# Altium footprint library footprints.PcbLib: 33 footprints (part 2 of 3)
Each footprint in its own frame and in the unit in brackets; x right, y up, seen from the top. Pads: shape width x height; smd on the part's side, far side on the other; paste and mask are expansions set on the pad; w line width, h text height; cw(c..) or ccw(c..) is an arc to the next point about the centre after c.
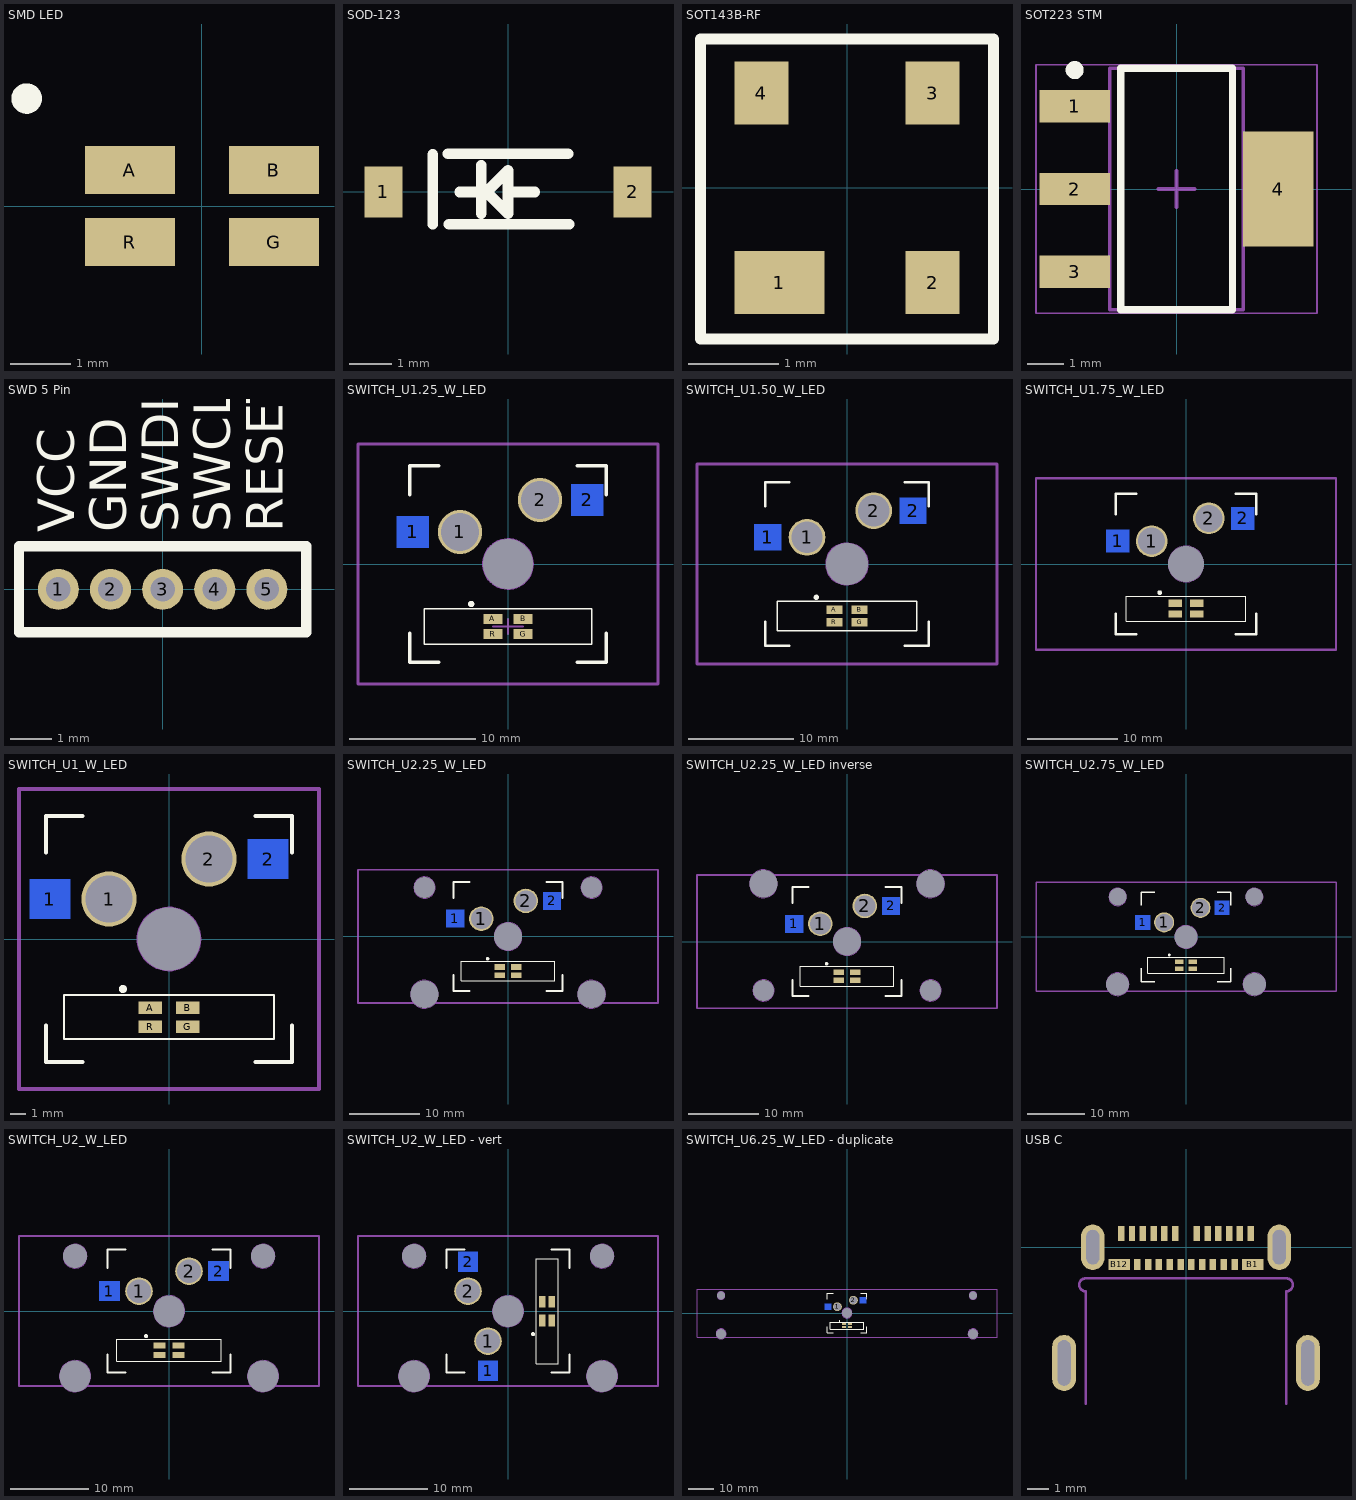
[diagram p1: the footprints below, top view; thin cyan lines are the x and y axes]

## SMD LED [mm] "LED"
pads (4):
  rect 1.5x0.8 smd: A(-1.2,0.6) B(1.2,0.6) G(1.2,-0.6) R(-1.2,-0.6)
Top Overlay:
  circle w0.254: c-2.921,1.791 r0.127
3D body "ASMB-MTB0-0A3A2.step": height 1.91, standoff 0.01, extent -1.93,-1.475 1.57,1.325

## SOD-123 [mm]
pads (2):
  rect 0.9x1.2 smd: 1(-2.95,0) 2(2.95,0)
Top Overlay:
  lines w0.254: -1.778,-0.762 -1.778,0.889 ; -1.422,0.902 1.422,0.902 ; -1.397,-0.762 1.448,-0.762 ; -1.143,0 -0.508,0 ; -0.635,-0.508 -0.635,0.635 ; 0,0 0.635,0 ; -0.508,0 0,0.508 0,-0.508 -0.508,0
3D body: height 1.35, standoff 0, extent -1.778,-0.762 1.448,0.902
3D body: height 1.36, standoff 0, extent -1.778,-0.762 -1.397,0.902

## SOT143B-RF [mm] "Reflow standard, nexperia"
pads (4):
  rect 1x0.7 smd: 1(-0.75,-1.05)
  rect 0.6x0.7 smd: 2(0.95,-1.05) 3(0.95,1.05) 4(-0.95,1.05)
Top Overlay:
  lines w0.127: -1.625,-1.676 1.625,-1.676 1.625,1.651 -1.625,1.651 -1.625,-1.676

## SOT223 STM [mm] "SOT223, 4-Leads, Body 6.50x7.00mm (avg), Pitch 2.30mm, IPC High Density"
height 1.8
pads (4):
  rect 1.95x0.9 smd: 1(-2.825,2.3) 2(-2.825,0) 3(-2.825,-2.3)
  rect 1.95x3.2 smd: 4(2.825,0)
Top Overlay:
  circle w0.25: c-2.825,3.3 r0.125
  lines w0.2: -1.55,-3.35 1.55,-3.35 1.55,3.35 -1.55,3.35 -1.55,-3.35
Mechanical 13:
  lines w0.1: -1.85,-3.35 1.85,-3.35 1.85,3.35 -1.85,3.35 -1.85,-3.35
Mechanical 15:
  lines w0.05: -3.9,-3.45 3.9,-3.45 3.9,3.45 -3.9,3.45 -3.9,-3.45
  lines w0.1: -0.5,0 0.5,0 ; 0,-0.5 0,0.5
3D body: height 1.8, standoff 0.02, extent -1.85,-3.35 1.85,3.35

## SWD 5 Pin [mm]
pads (5):
  round 1 hole 0.6: 1(-2.54,0) 2(-1.27,0) 3(0,0) 4(1.27,0) 5(2.54,0)
Top Overlay:
  lines w0.254: -3.5,-1.05 -3.5,1.05 3.5,1.05 3.5,-1.05 -3.5,-1.05
  text "RESET" at 2.921,1.397 h0.89
  text "SWCLK" at 1.651,1.397 h0.89
  text "SWDIO" at 0.381,1.397 h0.89
  text "GND" at -0.889,1.397 h0.89
  text "VCC" at -2.159,1.397 h0.89
Multi-Layer:
  region: 2.921,-0.762

## SWITCH_U1.25_W_LED [mm] "single mx switch w surface mount led underneath"
pads (9):
  rect 2.55x2.5 smd far side: 1(-7.56,2.54) 2(6.29,5.08)
  round 3.5 hole 3: 1(-3.81,2.54) 2(2.54,5.08)
  rect 1.5x0.8 smd: A(-1.2,-4.36) B(1.2,-4.36) G(1.2,-5.56) R(-1.2,-5.56)
  round 0 hole 3.988: ""(0,0)
Top Overlay:
  circle w0.254: c-2.921,-3.175 r0.127
  lines w0.127: -6.658,-6.36 6.658,-6.36 6.658,-3.56 -6.658,-3.56 -6.658,-6.36
  lines w0.254: -7.8,-5.5 -7.8,-7.8 -5.5,-7.8 ; -7.8,5.5 -7.8,7.8 -5.5,7.8 ; 5.5,-7.8 7.8,-7.8 7.8,-5.5 ; 5.5,7.8 7.8,7.8 7.8,5.5
Bottom Overlay:
  lines w0.254: -6.074,4.064 -6.074,7.239 4.826,7.239 4.826,6.604
Mechanical 1:
  circle w0.127: c0,0 r1.994
Mechanical 13:
  lines w0.127: -1.2,-4.96 1.2,-4.96 ; 0,-5.56 0,-4.36
  lines w0.254: -11.906,-9.525 -11.906,9.525 11.906,9.525 11.906,-9.525 -11.906,-9.525
3D body "kailh socket.STEP": height 1.86, standoff -1.19, extent -7.878,0.858 6.624,6.75
3D body "MXSWITCHCOMPLETE.STEP": height 14.38, standoff -3.39, extent -7.8,-7.8 7.8,7.8
3D body "ASMB-MTB0-0A3A2.step": height 1.91, standoff 0.01, extent -1.93,-6.441 1.57,-3.641

## SWITCH_U1.50_W_LED [mm] "single mx switch w surface mount led underneath"
pads (9):
  rect 2.55x2.5 smd far side: 1(-7.56,2.54) 2(6.29,5.08)
  round 3.5 hole 3: 1(-3.81,2.54) 2(2.54,5.08)
  rect 1.5x0.8 smd: A(-1.2,-4.36) B(1.2,-4.36) G(1.2,-5.56) R(-1.2,-5.56)
  round 0 hole 3.988: ""(0,0)
Top Overlay:
  circle w0.254: c-2.921,-3.175 r0.127
  lines w0.127: -6.658,-6.36 6.658,-6.36 6.658,-3.56 -6.658,-3.56 -6.658,-6.36
  lines w0.254: -7.8,-5.5 -7.8,-7.8 -5.5,-7.8 ; -7.8,5.5 -7.8,7.8 -5.5,7.8 ; 5.5,-7.8 7.8,-7.8 7.8,-5.5 ; 5.5,7.8 7.8,7.8 7.8,5.5
Bottom Overlay:
  lines w0.254: -6.074,4.064 -6.074,7.239 4.826,7.239 4.826,6.604
Mechanical 1:
  circle w0.127: c0,0 r1.994
Mechanical 13:
  lines w0.254: -14.287,-9.525 -14.287,9.525 14.287,9.525 14.287,-9.525 -14.287,-9.525
3D body "kailh socket.STEP": height 1.86, standoff -1.19, extent -7.878,0.858 6.624,6.75
3D body "ASMB-MTB0-0A3A2.step": height 1.91, standoff 0.01, extent -1.93,-6.441 1.57,-3.641
3D body "MXSWITCHCOMPLETE.STEP": height 14.38, standoff -3.39, extent -7.79,-7.67 7.81,7.93

## SWITCH_U1.75_W_LED [mm] "single mx switch w surface mount led underneath"
pads (9):
  rect 2.55x2.5 smd far side: 1(-7.56,2.54) 2(6.29,5.08)
  round 3.5 hole 3: 1(-3.81,2.54) 2(2.54,5.08)
  rect 1.5x0.8 smd: A(-1.2,-4.36) B(1.2,-4.36) G(1.2,-5.56) R(-1.2,-5.56)
  round 0 hole 3.988: ""(0,0)
Top Overlay:
  circle w0.254: c-2.921,-3.175 r0.127
  lines w0.127: -6.658,-6.36 -6.658,-3.56 6.658,-3.56 6.658,-6.36 -6.658,-6.36
  lines w0.254: -7.8,-5.5 -7.8,-7.8 -5.5,-7.8 ; -7.8,5.5 -7.8,7.8 -5.5,7.8 ; 5.5,-7.8 7.8,-7.8 7.8,-5.5 ; 5.5,7.8 7.8,7.8 7.8,5.5
Bottom Overlay:
  lines w0.254: -6.074,4.064 -6.074,7.239 4.826,7.239 4.826,6.604
Mechanical 1:
  circle w0.127: c0,0 r1.994
Mechanical 13:
  lines w0.254: -16.669,-9.525 -16.669,9.525 16.669,9.525 16.669,-9.525 -16.669,-9.525
3D body "kailh socket.STEP": height 1.86, standoff -1.19, extent -7.888,0.857 6.615,6.749
3D body "ASMB-MTB0-0A3A2.step": height 1.91, standoff 0.01, extent -1.98,-6.441 1.52,-3.641
3D body "MXSWITCHCOMPLETE.STEP": height 14.38, standoff -3.39, extent -7.8,-7.8 7.8,7.8

## SWITCH_U1_W_LED [mm] "single mx switch w surface mount led underneath"
pads (9):
  rect 2.55x2.5 smd far side: 1(-7.56,2.54) 2(6.29,5.08)
  round 3.5 hole 3: 1(-3.81,2.54) 2(2.54,5.08)
  rect 1.5x0.8 smd: A(-1.2,-4.36) B(1.2,-4.36) G(1.2,-5.56) R(-1.2,-5.56)
  round 0 hole 3.988: ""(0,0)
Top Overlay:
  circle w0.254: c-2.921,-3.175 r0.127
  lines w0.127: -6.658,-6.36 -6.658,-3.56 6.658,-3.56 6.658,-6.36 -6.658,-6.36
  lines w0.254: -7.8,-5.5 -7.8,-7.8 -5.5,-7.8 ; -7.8,5.5 -7.8,7.8 -5.5,7.8 ; 5.5,-7.8 7.8,-7.8 7.8,-5.5 ; 5.5,7.8 7.8,7.8 7.8,5.5
Bottom Overlay:
  lines w0.254: -6.074,4.064 -6.074,7.239 4.826,7.239 4.826,6.604
Mechanical 1:
  circle w0.127: c0,0 r1.994
Mechanical 13:
  lines w0.254: -9.525,-9.525 9.525,-9.525 9.525,9.525 -9.525,9.525 -9.525,-9.525
3D body "ASMB-MTB0-0A3A2.step": height 1.91, standoff 0.01, extent -1.93,-6.441 1.57,-3.641
3D body "MXSWITCHCOMPLETE.STEP": height 14.38, standoff -3.39, extent -7.8,-7.8 7.8,7.8
3D body "kailh socket.STEP": height 1.71, standoff -1.34, extent -7.879,0.858 6.624,6.75

## SWITCH_U2.25_W_LED [mm] "U2 mx switch w surface mount led underneath"
pads (13):
  rect 2.55x2.5 smd far side: 1(-7.56,2.54) 2(6.29,5.08)
  round 3.5 hole 3: 1(-3.81,2.54) 2(2.54,5.08)
  rect 1.5x0.8 smd: A(-1.2,-4.36) B(1.2,-4.36) G(1.2,-5.56) R(-1.2,-5.56)
  round 0 hole 3.988: ""(-11.938,-8.255) ""(0,0) ""(11.938,-8.255)
  round 0 hole 3.048: ""(-11.938,6.985) ""(11.938,6.985)
Top Overlay:
  circle w0.254: c-2.921,-3.175 r0.127
  lines w0.127: -6.658,-6.36 6.658,-6.36 6.658,-3.56 -6.658,-3.56 -6.658,-6.36
  lines w0.254: -7.8,-5.5 -7.8,-7.8 -5.5,-7.8 ; -7.8,5.5 -7.8,7.8 -5.5,7.8 ; 5.5,-7.8 7.8,-7.8 7.8,-5.5 ; 5.5,7.8 7.8,7.8 7.8,5.5
Bottom Overlay:
  lines w0.254: -6.074,4.064 -6.074,7.239 4.826,7.239 4.826,6.604
Mechanical 1:
  circle w0.127: c11.938,-8.255 r1.994
  circle w0.127: c-11.938,-8.255 r1.994
  circle w0.127: c11.938,6.985 r1.524
  circle w0.127: c-11.938,6.985 r1.524
  circle w0.127: c0,0 r1.994
Mechanical 13:
  lines w0.254: -21.431,-9.525 -21.431,9.525 21.431,9.525 21.431,-9.525 -21.431,-9.525
3D body "MXSWITCHCOMPLETE.STEP": height 14.38, standoff -3.39, extent -7.8,-7.8 7.8,7.8
3D body "ASMB-MTB0-0A3A2.step": height 1.91, standoff 0.01, extent -1.93,-6.441 1.57,-3.641
3D body "Cherry MX Stabilizer.STEP": height 12.17, standoff -2.79, extent -15.338,-10.955 -8.538,8.245
3D body "Cherry MX Stabilizer.STEP": height 12.17, standoff -2.79, extent 8.538,-10.955 15.338,8.245
3D body "kailh socket.STEP": height 1.86, standoff -1.19, extent -7.879,0.858 6.624,6.75

## SWITCH_U2.25_W_LED inverse [mm] "U2 mx switch w surface mount led underneath"
pads (13):
  rect 2.55x2.5 smd far side: 1(-7.56,2.54) 2(6.29,5.08)
  round 3.5 hole 3: 1(-3.81,2.54) 2(2.54,5.08)
  rect 1.5x0.8 smd: A(-1.2,-4.36) B(1.2,-4.36) G(1.2,-5.56) R(-1.2,-5.56)
  round 0 hole 3.048: ""(-11.938,-6.985) ""(11.938,-6.985)
  round 0 hole 3.988: ""(-11.938,8.255) ""(0,0) ""(11.938,8.255)
Top Overlay:
  circle w0.254: c-2.921,-3.175 r0.127
  lines w0.127: -6.658,-6.36 6.658,-6.36 6.658,-3.56 -6.658,-3.56 -6.658,-6.36
  lines w0.254: -7.8,-5.5 -7.8,-7.8 -5.5,-7.8 ; -7.8,5.5 -7.8,7.8 -5.5,7.8 ; 5.5,-7.8 7.8,-7.8 7.8,-5.5 ; 5.5,7.8 7.8,7.8 7.8,5.5
Bottom Overlay:
  lines w0.254: -6.074,4.064 -6.074,7.239 4.826,7.239 4.826,6.604
Mechanical 1:
  circle w0.127: c11.938,8.255 r1.994
  circle w0.127: c11.938,-6.985 r1.524
  circle w0.127: c-11.938,8.255 r1.994
  circle w0.127: c-11.938,-6.985 r1.524
  circle w0.127: c0,0 r1.994
Mechanical 13:
  lines w0.254: -21.431,-9.525 21.431,-9.525 21.431,9.525 -21.431,9.525 -21.431,-9.525

## SWITCH_U2.75_W_LED [mm] "U2 mx switch w surface mount led underneath"
pads (13):
  rect 2.55x2.5 smd far side: 1(-7.56,2.54) 2(6.29,5.08)
  round 3.5 hole 3: 1(-3.81,2.54) 2(2.54,5.08)
  rect 1.5x0.8 smd: A(-1.2,-4.36) B(1.2,-4.36) G(1.2,-5.56) R(-1.2,-5.56)
  round 0 hole 3.988: ""(-11.938,-8.255) ""(0,0) ""(11.938,-8.255)
  round 0 hole 3.048: ""(-11.938,6.985) ""(11.938,6.985)
Top Overlay:
  circle w0.254: c-2.921,-3.175 r0.127
  lines w0.127: -6.658,-6.36 -6.658,-3.56 6.658,-3.56 6.658,-6.36 -6.658,-6.36
  lines w0.254: -7.8,-5.5 -7.8,-7.8 -5.5,-7.8 ; -7.8,5.5 -7.8,7.8 -5.5,7.8 ; 5.5,-7.8 7.8,-7.8 7.8,-5.5 ; 5.5,7.8 7.8,7.8 7.8,5.5
Bottom Overlay:
  lines w0.254: -6.074,4.064 -6.074,7.239 4.826,7.239 4.826,6.604
Mechanical 1:
  circle w0.127: c11.938,-8.255 r1.994
  circle w0.127: c11.938,6.985 r1.524
  circle w0.127: c-11.938,-8.255 r1.994
  circle w0.127: c-11.938,6.985 r1.524
  circle w0.127: c0,0 r1.994
Mechanical 13:
  lines w0.254: -26.194,-9.525 -26.194,9.525 26.194,9.525 26.194,-9.525 -26.194,-9.525
3D body "MXSWITCHCOMPLETE.STEP": height 14.38, standoff -3.39, extent -7.8,-7.8 7.8,7.8
3D body "ASMB-MTB0-0A3A2.step": height 1.91, standoff 0.01, extent -1.57,-6.441 1.93,-3.641
3D body "Cherry MX Stabilizer.STEP": height 12.17, standoff -2.79, extent 8.538,-10.955 15.338,8.245
3D body "Cherry MX Stabilizer.STEP": height 12.17, standoff -2.79, extent -15.338,-10.955 -8.538,8.245
3D body "kailh socket.STEP": height 1.86, standoff -1.19, extent -7.879,0.858 6.624,6.75

## SWITCH_U2_W_LED [mm] "U2 mx switch w surface mount led underneath"
pads (13):
  rect 2.55x2.5 smd far side: 1(-7.56,2.54) 2(6.29,5.08)
  round 3.5 hole 3: 1(-3.81,2.54) 2(2.54,5.08)
  rect 1.5x0.8 smd: A(-1.2,-4.36) B(1.2,-4.36) G(1.2,-5.56) R(-1.2,-5.56)
  round 0 hole 3.988: ""(-11.938,-8.255) ""(0,0) ""(11.938,-8.255)
  round 0 hole 3.048: ""(-11.938,6.985) ""(11.938,6.985)
Top Overlay:
  circle w0.254: c-2.921,-3.175 r0.127
  lines w0.127: -6.658,-6.36 6.658,-6.36 6.658,-3.56 -6.658,-3.56 -6.658,-6.36
  lines w0.254: -7.8,-5.5 -7.8,-7.8 -5.5,-7.8 ; -7.8,5.5 -7.8,7.8 -5.5,7.8 ; 5.5,-7.8 7.8,-7.8 7.8,-5.5 ; 5.5,7.8 7.8,7.8 7.8,5.5
Bottom Overlay:
  lines w0.254: -6.074,4.064 -6.074,7.239 4.826,7.239 4.826,6.604
Mechanical 1:
  circle w0.127: c11.938,-8.255 r1.994
  circle w0.127: c11.938,6.985 r1.524
  circle w0.127: c-11.938,-8.255 r1.994
  circle w0.127: c-11.938,6.985 r1.524
  circle w0.127: c0,0 r1.994
Mechanical 13:
  lines w0.254: -19.05,-9.525 19.05,-9.525 19.05,9.525 -19.05,9.525 -19.05,-9.525
3D body "Cherry MX Stabilizer.STEP": height 12.17, standoff -2.79, extent 8.741,-10.93 15.542,8.27
3D body "ASMB-MTB0-0A3A2.step": height 1.91, standoff 0.01, extent -1.57,-6.441 1.93,-3.641
3D body "MXSWITCHCOMPLETE.STEP": height 14.38, standoff -3.39, extent -7.8,-7.8 7.8,7.8
3D body "Cherry MX Stabilizer.STEP": height 12.17, standoff -2.79, extent -15.338,-10.955 -8.538,8.245
3D body "kailh socket.STEP": height 1.86, standoff -1.19, extent -7.879,0.858 6.624,6.75

## SWITCH_U2_W_LED - vert [mm] "U2 mx switch w surface mount led underneath"
pads (13):
  rect 2.5x2.55 smd far side: 1(-2.54,-7.56) 2(-5.08,6.29)
  round 3.5 hole 3: 1(-2.54,-3.81) 2(-5.08,2.54)
  rect 0.8x1.5 smd: A(4.36,-1.2) B(4.36,1.2) G(5.56,1.2) R(5.56,-1.2)
  round 0 hole 3.988: ""(-11.938,-8.255) ""(0,0) ""(11.938,-8.255)
  round 0 hole 3.048: ""(-11.938,6.985) ""(11.938,6.985)
Top Overlay:
  circle w0.254: c3.175,-2.921 r0.127
  lines w0.127: 3.56,-6.658 6.36,-6.658 6.36,6.658 3.56,6.658 3.56,-6.658
  lines w0.254: -7.8,-5.5 -7.8,-7.8 -5.5,-7.8 ; -7.8,5.5 -7.8,7.8 -5.5,7.8 ; 5.5,-7.8 7.8,-7.8 7.8,-5.5 ; 5.5,7.8 7.8,7.8 7.8,5.5
Bottom Overlay:
  lines w0.254: -6.604,4.826 -7.239,4.826 -7.239,-6.074 -4.064,-6.074
Mechanical 1:
  circle w0.127: c11.938,-8.255 r1.994
  circle w0.127: c11.938,6.985 r1.524
  circle w0.127: c-11.938,-8.255 r1.994
  circle w0.127: c-11.938,6.985 r1.524
  circle w0.127: c0,0 r1.994
Mechanical 13:
  lines w0.254: -19.05,-9.525 19.05,-9.525 19.05,9.525 -19.05,9.525 -19.05,-9.525
3D body "Cherry MX Stabilizer.STEP": height 12.17, standoff -2.79, extent -15.338,-10.955 -8.538,8.245
3D body "Cherry MX Stabilizer.STEP": height 12.17, standoff -2.79, extent 8.538,-10.955 15.338,8.245
3D body "ASMB-MTB0-0A3A2.step": height 1.91, standoff 0.01, extent 3.491,-1.98 6.291,1.52
3D body "MXSWITCHCOMPLETE.STEP": height 14.38, standoff -3.39, extent -7.8,-7.8 7.8,7.8
3D body "kailh socket.STEP": height 1.86, standoff -1.19, extent -6.75,-7.879 -0.858,6.624

## SWITCH_U6.25_W_LED - duplicate [mm] "U6.25 mx switch w surface mount led underneath"
pads (13):
  rect 2.55x2.5 smd far side: 1(-7.56,2.54) 2(6.29,5.08)
  round 3.5 hole 3: 1(-3.81,2.54) 2(2.54,5.08)
  rect 1.5x0.8 smd: A(-1.2,-4.36) B(1.2,-4.36) G(1.2,-5.56) R(-1.2,-5.56)
  round 0 hole 3.988: ""(-50,-8.255) ""(0,0) ""(50,-8.255)
  round 0 hole 3.048: ""(-50,6.985) ""(50,6.985)
Top Overlay:
  circle w0.254: c-2.921,-3.175 r0.127
  lines w0.127: -6.658,-6.36 -6.658,-3.56 6.658,-3.56 6.658,-6.36 -6.658,-6.36
  lines w0.254: -7.8,-5.5 -7.8,-7.8 -5.5,-7.8 ; -7.8,5.5 -7.8,7.8 -5.5,7.8 ; 5.5,-7.8 7.8,-7.8 7.8,-5.5 ; 5.5,7.8 7.8,7.8 7.8,5.5
Bottom Overlay:
  lines w0.254: -6.074,4.064 -6.074,7.239 4.826,7.239 4.826,6.604
Mechanical 1:
  circle w0.127: c0,0 r1.994
  circle w0.127: c-50,6.985 r1.524
  circle w0.127: c-50,-8.255 r1.994
  circle w0.127: c50,6.985 r1.524
  circle w0.127: c50,-8.255 r1.994
Mechanical 13:
  lines w0.127: -59.531,9.525 -7.144,9.525
  lines w0.254: -59.531,-9.525 -59.531,9.525 59.531,9.525 59.531,-9.525 -59.531,-9.525
3D body "MXSWITCHCOMPLETE.STEP": height 14.38, standoff -3.39, extent -7.8,-7.8 7.8,7.8
3D body "ASMB-MTB0-0A3A2.step": height 1.91, standoff 0.01, extent -1.52,-6.441 1.98,-3.641
3D body "Cherry MX Stabilizer.STEP": height 12.17, standoff -2.79, extent 46.6,-10.955 53.4,8.245
3D body "Cherry MX Stabilizer.STEP": height 12.17, standoff -2.79, extent -53.4,-10.955 -46.6,8.245
3D body "kailh socket.STEP": height 1.86, standoff -1.19, extent -7.888,0.857 6.615,6.749

## USB C [mm]
pads (28):
  rect 0.3x0.7 smd: A1(-3.002,0.633) A2(-2.502,0.633) A3(-2.002,0.633) A4(-1.502,0.633) A5(-1.002,0.633) A6(-0.502,0.633) A7(0.498,0.633) A8(0.998,0.633) A9(1.498,0.633) A10(1.998,0.633) A11(2.498,0.633) A12(2.998,0.633)
  rect 1x0.508 smd: B1(3.098,-0.795) B12(-3.102,-0.795)
  rect 0.3x0.508 smd: B2(2.248,-0.795) B3(1.748,-0.795) B4(1.248,-0.795) B5(0.748,-0.795) B6(0.248,-0.795) B7(-0.252,-0.795) B8(-0.752,-0.795) B9(-1.252,-0.795) B10(-1.752,-0.795) B11(-2.252,-0.795)
  oval 1.1x2.6 hole 0.6 slot 2.1 at 90 deg: ""(-5.65,-5.361) ""(5.65,-5.361)
  oval 1.1x2.1 hole 0.6 slot 1.6 at 90 deg: ""(-4.32,0) ""(4.32,0)
Mechanical 1:
  circle w0.127: c5.65,-6.121 r0.3
  circle w0.127: c5.65,-4.623 r0.3
  circle w0.127: c-5.65,-4.623 r0.3
  circle w0.127: c-5.65,-6.121 r0.3
  circle w0.127: c4.32,0.508 r0.3
  circle w0.127: c4.32,-0.508 r0.3
  circle w0.127: c-4.32,-0.508 r0.3
  circle w0.127: c-4.32,0.508 r0.3
  lines w0.127: -5.95,-6.121 -5.95,-4.623 ; -5.35,-6.121 -5.35,-4.623 ; -4.65,-7.239 -4.65,-2.64 -4.65,-2.04 cw(c-4.65,-1.74) -4.65,-1.44 4.65,-1.44 cw(c4.65,-1.74) 4.65,-2.04 4.65,-2.64 4.65,-7.239 ; -4.62,-0.508 -4.62,0.508 ; -4.02,-0.508 -4.02,0.508 ; 4.02,-0.508 4.02,0.508 ; 4.62,-0.508 4.62,0.508 ; 5.35,-6.121 5.35,-4.623 ; 5.95,-6.121 5.95,-4.623
3D body "USBC.stp": height 2.21, standoff -0.95, extent -5.8,-7.24 5.8,0.66